# Altium footprint library 3D封装库.PcbLib: 716 footprints (part 32 of 45)
Each footprint in its own frame and in the unit in brackets; x right, y up, seen from the top. Pads: shape width x height; smd on the part's side, far side on the other; paste and mask are expansions set on the pad; w line width, h text height; cw(c..) or ccw(c..) is an arc to the next point about the centre after c.
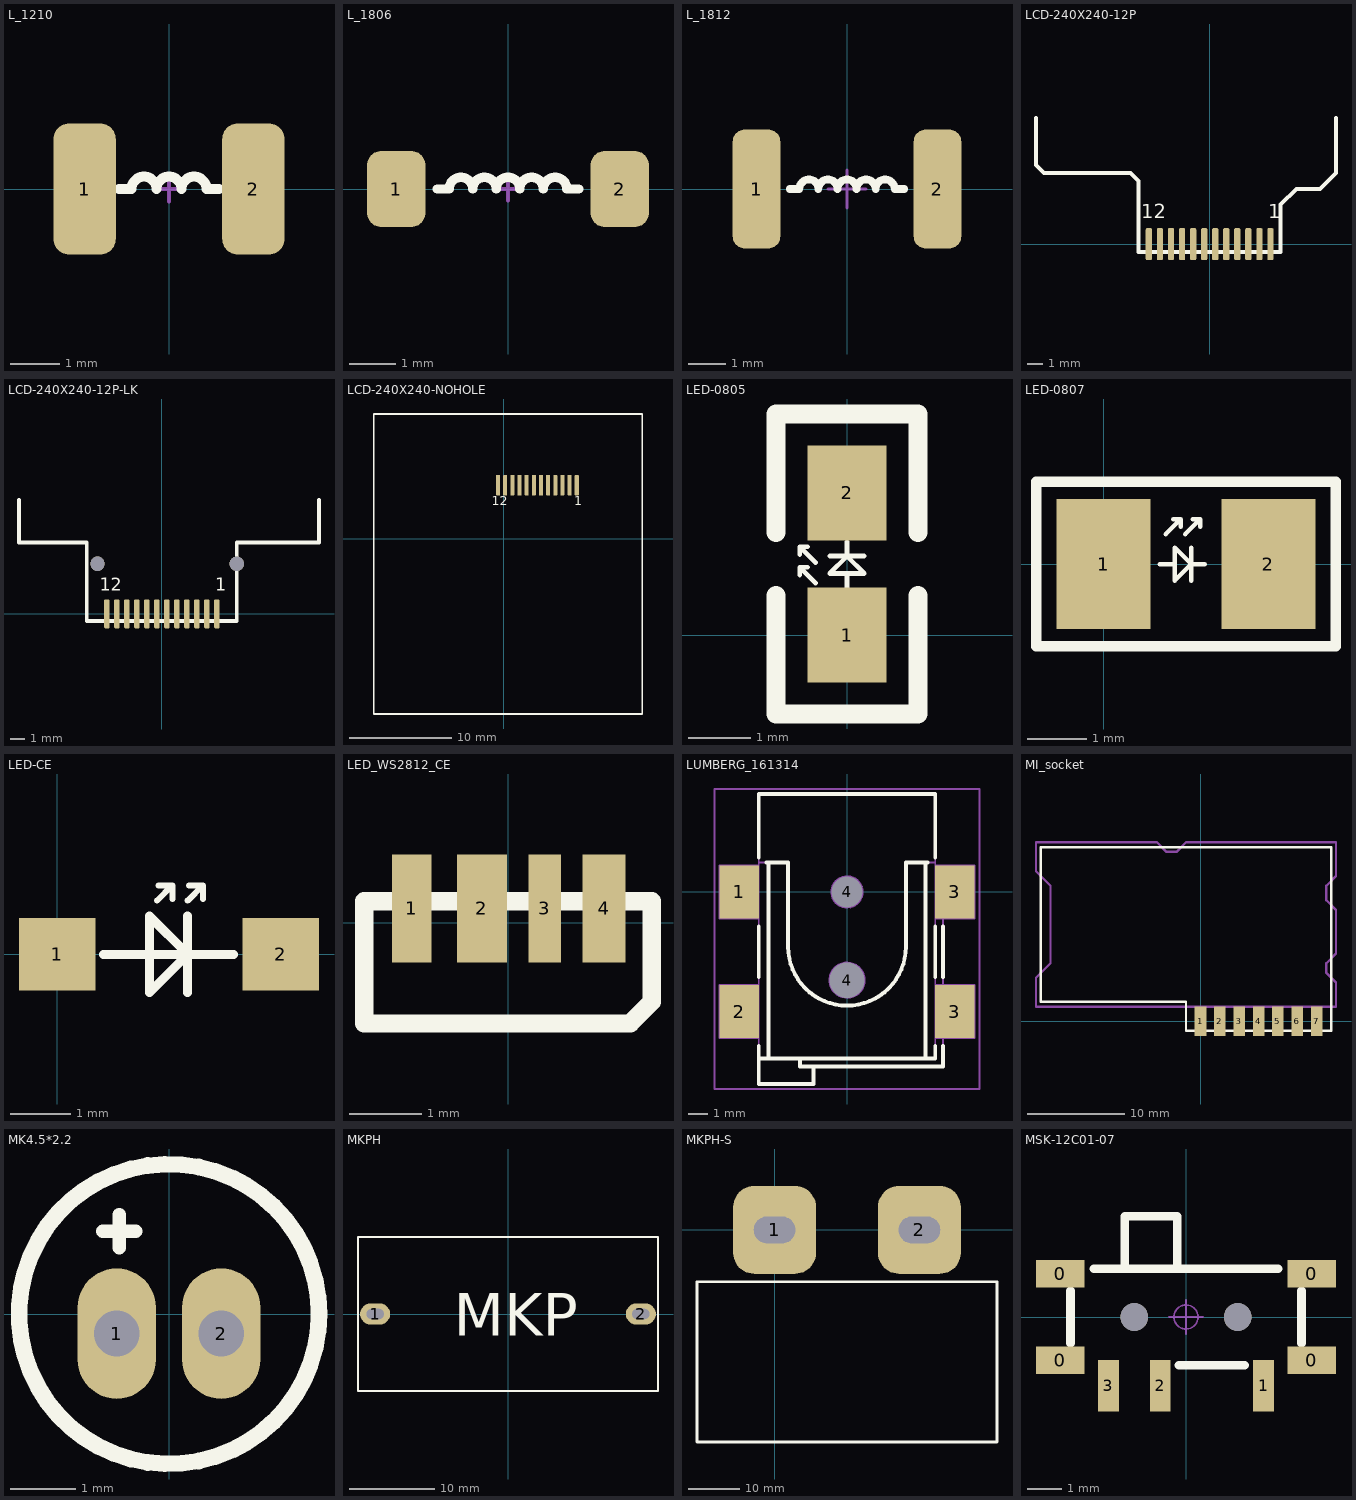
[diagram p31: the footprints below, top view; thin cyan lines are the x and y axes]

## L_1210 [mil] "小功率贴片电感"
pads (2):
  rrect50% 50x105 smd: 1(-67.5,0) 2(67.5,0)
Top Overlay:
  lines w8: -40,0 -30,0 cw(c-20,0) -10,0 cw(c0,0) 10,0 cw(c20,0) 30,0 40,0
Mechanical 15:
  lines w3: -10,0 10,0 ; 0,-10 0,10
3D body "1210.STEP": height 51.18, standoff -0.19, extent -62.99,-49.21 62.99,49.21

## L_1806 [mil] "小功率贴片电感"
pads (2):
  rrect50% 50x65 smd: 1(-95,0) 2(95,0)
Top Overlay:
  lines w8: -60,0 -50,0 cw(c-40,0) -30,0 cw(c-20,0) -10,0 cw(c0,0) 10,0 cw(c20,0) 30,0 cw(c40,0) 50,0 60,0
Mechanical 15:
  lines w3: -10,0 10,0 ; 0,-10 0,10
3D body "1806.STEP": height 62.99, standoff -0.19, extent -88.58,-31.5 88.58,31.5

## L_1812 [mil] "小功率贴片电感"
pads (2):
  rrect50% 50x125 smd: 1(-95,0) 2(95,0)
Top Overlay:
  lines w8: -60,0 -50,0 cw(c-40,0) -30,0 cw(c-20,0) -10,0 cw(c0,0) 10,0 cw(c20,0) 30,0 cw(c40,0) 50,0 60,0
Mechanical 15:
  lines w3: -20,0 20,0 ; 0,-20 0,20
3D body "1812.STEP": height 59.06, standoff -0.19, extent -88.58,-62.99 88.58,62.99

## LCD-240X240-12P [mm]
height 0.8
pads (12):
  rrect50% 0.4x2.032 smd: 1(3.85,0) 2(3.15,0) 3(2.45,0) 4(1.75,0) 5(1.05,0) 6(0.35,0) 7(-0.35,0) 8(-1.05,0) 9(-1.75,0) 10(-2.45,0) 11(-3.15,0) 12(-3.85,0)
Top Overlay:
  lines w0.254: -11,8 -11,5 -10.5,4.5 -5,4.5 -4.5,4 -4.5,-0.5 4.5,-0.5 4.5,2.5 5.5,3.5 7,3.5 8,4.5 8,8
  text "1" at 3.72,1.31 h1.52
  text "12" at -4.348,1.31 h1.52

## LCD-240X240-12P-LK [mm]
height 0.8
pads (12):
  rrect50% 0.4x2.032 smd: 1(3.85,0) 2(3.15,0) 3(2.45,0) 4(1.75,0) 5(1.05,0) 6(0.35,0) 7(-0.35,0) 8(-1.05,0) 9(-1.75,0) 10(-2.45,0) 11(-3.15,0) 12(-3.85,0)
via -4.5,3.5 diameter 1 hole 1
via 5.25,3.5 diameter 1 hole 1
Top Overlay:
  lines w0.254: -10,8 -10,5 -5.25,5 -5.25,-0.5 5.25,-0.5 5.25,5 11,5 11,8
  text "12" at -4.348,1.31 h1.52
  text "1" at 3.72,1.31 h1.52

## LCD-240X240-NOHOLE [mil]
height 31.5
pads (12):
  rrect50% 15.75x80 smd: 1(282,207) 2(254.44,207) 3(226.88,207) 4(199.32,207) 5(171.76,207) 6(144.2,207) 7(116.65,207) 8(89.09,207) 9(61.53,207) 10(33.97,207) 11(6.41,207) 12(-21.15,207)
Top Overlay:
  lines w6: -499.3,-674 533.7,-674 533.7,481 -499.3,481 -499.3,-674
  text "1" at 272.45,118.51 h60
  text "12" at -45.22,118.51 h60
3D body "tft.step": height 19.59, standoff -116.35, extent -499.31,-673.34 533.69,565.47

## LED-0805 [mil]
pads (2):
  rect 50x60 smd: 1(0,0) 2(0,90)
Top Overlay:
  lines w3: -30,38 -30,43 ; -30,51 -30,56 ; -25,43 -30,43 ; -25,56 -30,56 ; -20,33 -30,43 ; -20,46 -30,56 ; -11,50 11,50 ; 0,29 0,39 ; 0,59 0,50 ; 0,50 -11,39 11,39 0,50
  lines w12: -45,25 -45,-50 45,-50 45,25 ; -45,65 -45,140 45,140 45,65
3D body: height 39.57, standoff 0, extent -3.94,41.07 3.94,48.93
3D body: height 19.68, standoff 0, extent -20,0 20,90
3D body: height 39.37, standoff 19.68, extent -20,20 20,70

## LED-0807 [mm]
pads (2):
  rect 1.6x2.2 smd: 1(0,0) 2(2.794,0)
Top Overlay:
  lines w0.076: 0.953,0 1.207,0 ; 1.054,0.508 1.308,0.762 ; 1.181,0.762 1.308,0.762 ; 1.308,0.635 1.308,0.762 ; 1.385,0.508 1.639,0.762 ; 1.486,-0.279 1.486,0.279 ; 1.512,0.762 1.639,0.762 ; 1.639,0.635 1.639,0.762 ; 1.715,0 1.486,0 ; 1.486,0 1.207,-0.279 1.207,0.279 1.486,0
  lines w0.178: -1.143,-1.397 3.937,-1.397 3.937,1.397 -1.143,1.397 -1.143,-1.397

## LED-CE [mm]
pads (2):
  rect 1.27x1.2 smd: 1(0,0) 2(3.7,0)
Top Overlay:
  lines w0.1: 1.651,0.889 1.905,1.143 ; 1.676,1.143 1.905,1.143 ; 1.905,0.914 1.905,1.143 ; 2.159,0.889 2.413,1.143 ; 2.184,1.143 2.413,1.143 ; 2.413,0.914 2.413,1.143
  lines w0.15: 0.762,0 2.921,0 ; 2.159,-0.635 2.159,0.635 ; 1.524,-0.635 2.159,0 1.524,0.635 1.524,-0.635

## LED_WS2812_CE [mm]
pads (4):
  rect 0.55x1.5 smd: 1(-1.338,0.2)
  rect 0.7x1.5 smd: 2(-0.363,0.2)
  rect 0.45x1.5 smd: 3(0.512,0.2)
  rect 0.6x1.5 smd: 4(1.337,0.2)
Top Overlay:
  lines w0.254: -2,-1.4 1.7,-1.4 2,-1.1 2,0.3 -2,0.3 -2,-1.4

## LUMBERG_161314 [mm]
pads (6):
  rect 2x2.7 smd: 1(-5.5,0) 2(-5.5,-6.1) 3(5.5,-6.1) 3(5.5,0)
  round 1 hole 1.8 unplated mask+0.4: 4(0,-4.5)
  round 1 hole 1.6 unplated mask+0.3: 4(0,0)
Top Overlay:
  lines w0.2: -4.5,-7.85 -4.5,-8.5 ; -4.5,-4.35 -4.5,-1.75 ; -4.5,1.75 -4.5,5 4.5,5 4.5,1.75 ; -4.1,1.5 -3,1.5 -3,-2.8 ccw(c0,-2.8) 3,-2.8 3,1.5 4.1,1.5 ; -4,-8.5 -4,1.5 ; -2.4,-8.5 -2.4,-8.9 4.9,-8.9 4.9,-7.85 ; -1.7,-8.9 -1.7,-9.8 -4.5,-9.8 -4.5,-8.5 ; 4,-8.5 4,1.5 ; 4.5,-7.85 4.5,-8.5 -4.5,-8.5 ; 4.5,-4.35 4.5,-1.75 ; 4.9,-4.35 4.9,-1.75
Mechanical 8:
  circle w0.1: c0,0 r0.8
  circle w0.1: c0,-4.5 r0.9
  lines w0.1: -6,-6.1 -5.5,-6.1 ; -6,0 -5.5,0 ; -5.5,-6.6 -5.5,-6.1 ; -5.5,-5.6 -5.5,-6.1 ; -5.5,-0.5 -5.5,0 ; -5.5,0.5 -5.5,0 ; -5,-6.1 -5.5,-6.1 ; -5,0 -5.5,0 ; -0.5,-4.5 0,-4.5 ; -0.5,0 0,0 ; 0,-5 0,-4.5 ; 0,-4 0,-4.5 ; 0,-0.5 0,0 ; 0,0.5 0,0 ; 0.5,-4.5 0,-4.5 ; 0.5,0 0,0 ; 5,-6.1 5.5,-6.1 ; 5,0 5.5,0 ; 5.5,-6.6 5.5,-6.1 ; 5.5,-5.6 5.5,-6.1 ; 5.5,-0.5 5.5,0 ; 5.5,0.5 5.5,0 ; 6,-6.1 5.5,-6.1 ; 6,0 5.5,0 ; -6.5,-7.45 -6.5,-4.75 -4.5,-4.75 -4.5,-7.45 -6.5,-7.45 ; -6.5,-1.35 -6.5,1.35 -4.5,1.35 -4.5,-1.35 -6.5,-1.35 ; 4.5,-7.45 4.5,-4.75 6.5,-4.75 6.5,-7.45 4.5,-7.45 ; 4.5,-1.35 4.5,1.35 6.5,1.35 6.5,-1.35 4.5,-1.35
Mechanical 14:
  lines w0.1: -4.9,-6.85 -4.9,-5.35 ; -4.9,-0.75 -4.9,0.75 ; -4.5,-6.85 -6.3,-6.85 -6.3,-5.35 -4.5,-5.35 ; -4.5,-0.75 -6.3,-0.75 -6.3,0.75 -4.5,0.75 ; -4.5,1.5 -3,1.5 -3,-2.8 ccw(c0,-2.8) 3,-2.8 3,1.5 4.5,1.5 ; -4,-8.5 -4,1.5 ; -2.4,-8.5 -2.4,-8.9 4.9,-8.9 4.9,0.75 ; -1.7,-8.9 -1.7,-9.8 -4.5,-9.8 -4.5,-8.5 ; 4,-8.5 4,1.5 ; 4.5,0.75 6.3,0.75 6.3,-0.75 4.9,-0.75 ; 4.9,-6.85 6.3,-6.85 6.3,-5.35 4.9,-5.35 ; -4.5,-8.5 4.5,-8.5 4.5,5 -4.5,5 -4.5,-8.5
Mechanical 15:
  lines w0.1: -6.75,-10.05 -6.75,5.25 6.75,5.25 6.75,-10.05 -6.75,-10.05
3D body "LUMBERG_161314.stp": height 11, standoff -1.2, extent -6.3,-9.8 6.3,5

## MI_socket [mm]
pads (7):
  rect 1.2x3 smd: 1(0,0) 2(2,0) 3(4,0) 4(6,0) 5(8,0) 6(10,0) 7(12,0)
Top Overlay:
  lines w0.254: -16.5,2 -1.5,2 -1.5,-1 13.5,-1 13.5,18 -16.5,18 -16.5,2
Mechanical 1:
  lines w0.254: -17,1.5 -17,4.5 -15.5,6 -15.5,14 -17,15.5 -17,18.5 -4.5,18.5 -3.5,17.5 -2.5,17.5 -1.5,18.5 14,18.5 14,15 13,14 13,12.5 14,11.5 14,7 13,6 13,5 14,4 14,1.5 -17,1.5
3D body "插座模块.step": height 2.8, standoff 0.1, extent -16.5,-1 13.5,18

## MK4.5*2.2 [mm]
height 2.2
pads (2):
  oval 1.2x2 hole 0.7: 1(-0.8,-0.3) 2(0.8,-0.3)
Top Overlay:
  circle w0.254: c0,0 r2.3
  lines w0.203: -1.016,1.27 -0.508,1.27 ; -0.762,1.016 -0.762,1.524
3D body "MK4522.STEP": height 2.2, standoff -2.2, extent -2.25,-2.25 2.25,2.25

## MKPH [mm]
pads (2):
  oval 3.5x2.5 hole 1.2 slot 2 at 0 deg: 1(-15.5,0) 2(15.5,0)
Top Overlay:
  lines w0.254: -17.5,-9 -17.5,9 17.5,9 17.5,-9 -17.5,-9
  text "MKP" at -6.35,-2.54 h5

## MKPH-S [mm]
pads (2):
  rrect50% 16x17 hole 5.2 slot 8 at 0 deg: 1(0,0) 2(28,0)
Top Overlay:
  lines w0.5: -15,-41 43,-41 43,-10 -15,-10 -15,-41

## MSK-12C01-07 [mm]
pads (9):
  rect 1.4x0.8 smd: 0(-3.65,-1.25) 0(-3.65,1.25) 0(3.65,-1.25) 0(3.65,1.25)
  rect 0.6x1.5 smd: 1(2.25,-1.996) 2(-0.75,-1.996) 3(-2.25,-1.996)
  round 0.8 hole 0.8: " "(-1.5,0) " "(1.5,0)
Top Overlay:
  lines w0.254: -3.35,-0.762 -3.35,0.762 ; -2.667,1.397 2.667,1.397 ; -1.778,1.4 -1.778,2.921 -0.254,2.921 -0.254,1.4 ; -0.206,-1.397 1.699,-1.397 ; 3.35,-0.762 3.35,0.762
Mechanical 15:
  circle w0.05: c0,0 r0.35
  lines w0.05: -0.5,0 0.5,0 ; 0,-0.5 0,0.5
3D body "MSK-12C01-07.STEP": height 1.5, standoff -0.5, extent -3.92,-2.4 3.92,2.9